# Altium footprint library SPI200M1-240x320屏幕模块-封装库.PcbLib: 2 footprints
Each footprint in its own frame and in the unit in brackets; x right, y up, seen from the top. Pads: shape width x height; smd on the part's side, far side on the other; paste and mask are expansions set on the pad; w line width, h text height; cw(c..) or ccw(c..) is an arc to the next point about the centre after c.
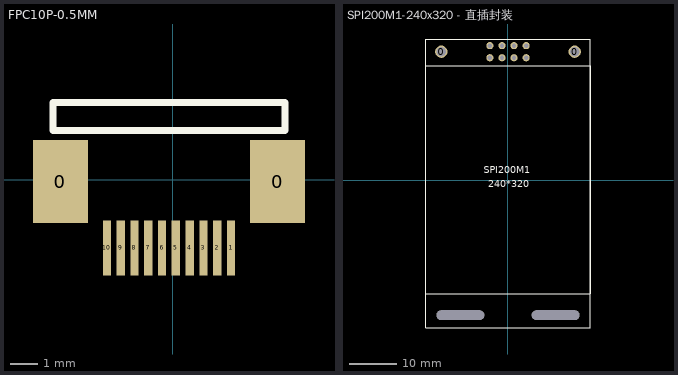
[diagram p0: the footprints below, top view; thin cyan lines are the x and y axes]

## FPC10P-0.5MM [mm]
pads (12):
  rect 2x3 smd: 0(-4.063,-0.068) 0(3.809,-0.068)
  rect 0.3x2 smd: 1(2.123,-2.472) 2(1.623,-2.472) 3(1.123,-2.472) 4(0.623,-2.472) 5(0.123,-2.472) 6(-0.377,-2.472) 7(-0.877,-2.472) 8(-1.377,-2.472) 9(-1.877,-2.472) 10(-2.377,-2.472)
Top Overlay:
  lines w0.254: -4.328,1.779 4.072,1.779 4.072,2.795 -4.328,2.795 -4.328,1.779
3D body "FPC-10P0.5mm.stp": height 2, standoff 0, extent -4.626,-3.044 4.372,2.962

## SPI200M1-240x320 - 直插封装 [mm]
pads (12):
  round 2.6 hole 2: 0(-14,27.005) 0(14,27.005)
  round 0 hole 2 slot 10 at 0 deg: 0(-10,-28.275) 0(10,-28.275)
  round 1.5 hole 0.9: 1(-3.81,25.735) 2(-3.81,28.275) 3(-1.27,25.735) 4(-1.27,28.275) 5(1.27,25.735) 6(1.27,28.275) 7(3.81,25.735) 8(3.81,28.275)
Top Overlay:
  lines w0.203: -17.3,-23.735 17.3,-23.735 17.3,24.065 -17.3,24.065 -17.3,-23.735
  lines w0.254: -17.3,-23.735 -17.3,-30.865 17.3,-30.865 17.3,-23.735 ; -17.3,-23.735 -17.3,24.065 ; -17.3,-23.735 17.3,-23.735 ; -17.3,24.065 -17.3,29.676 17.3,29.676 17.3,24.065 ; -17.3,24.065 17.3,24.065 ; 17.3,-23.735 17.3,24.065
  text "240*320" at -4.096,-1.983 h2.54
  text "SPI200M1" at -5.055,0.932 h2.54